# Altium footprint library Connector.PcbLib: 230 footprints (part 13 of 15)
Each footprint in its own frame and in the unit in brackets; x right, y up, seen from the top. Pads: shape width x height; smd on the part's side, far side on the other; paste and mask are expansions set on the pad; w line width, h text height; cw(c..) or ccw(c..) is an arc to the next point about the centre after c.
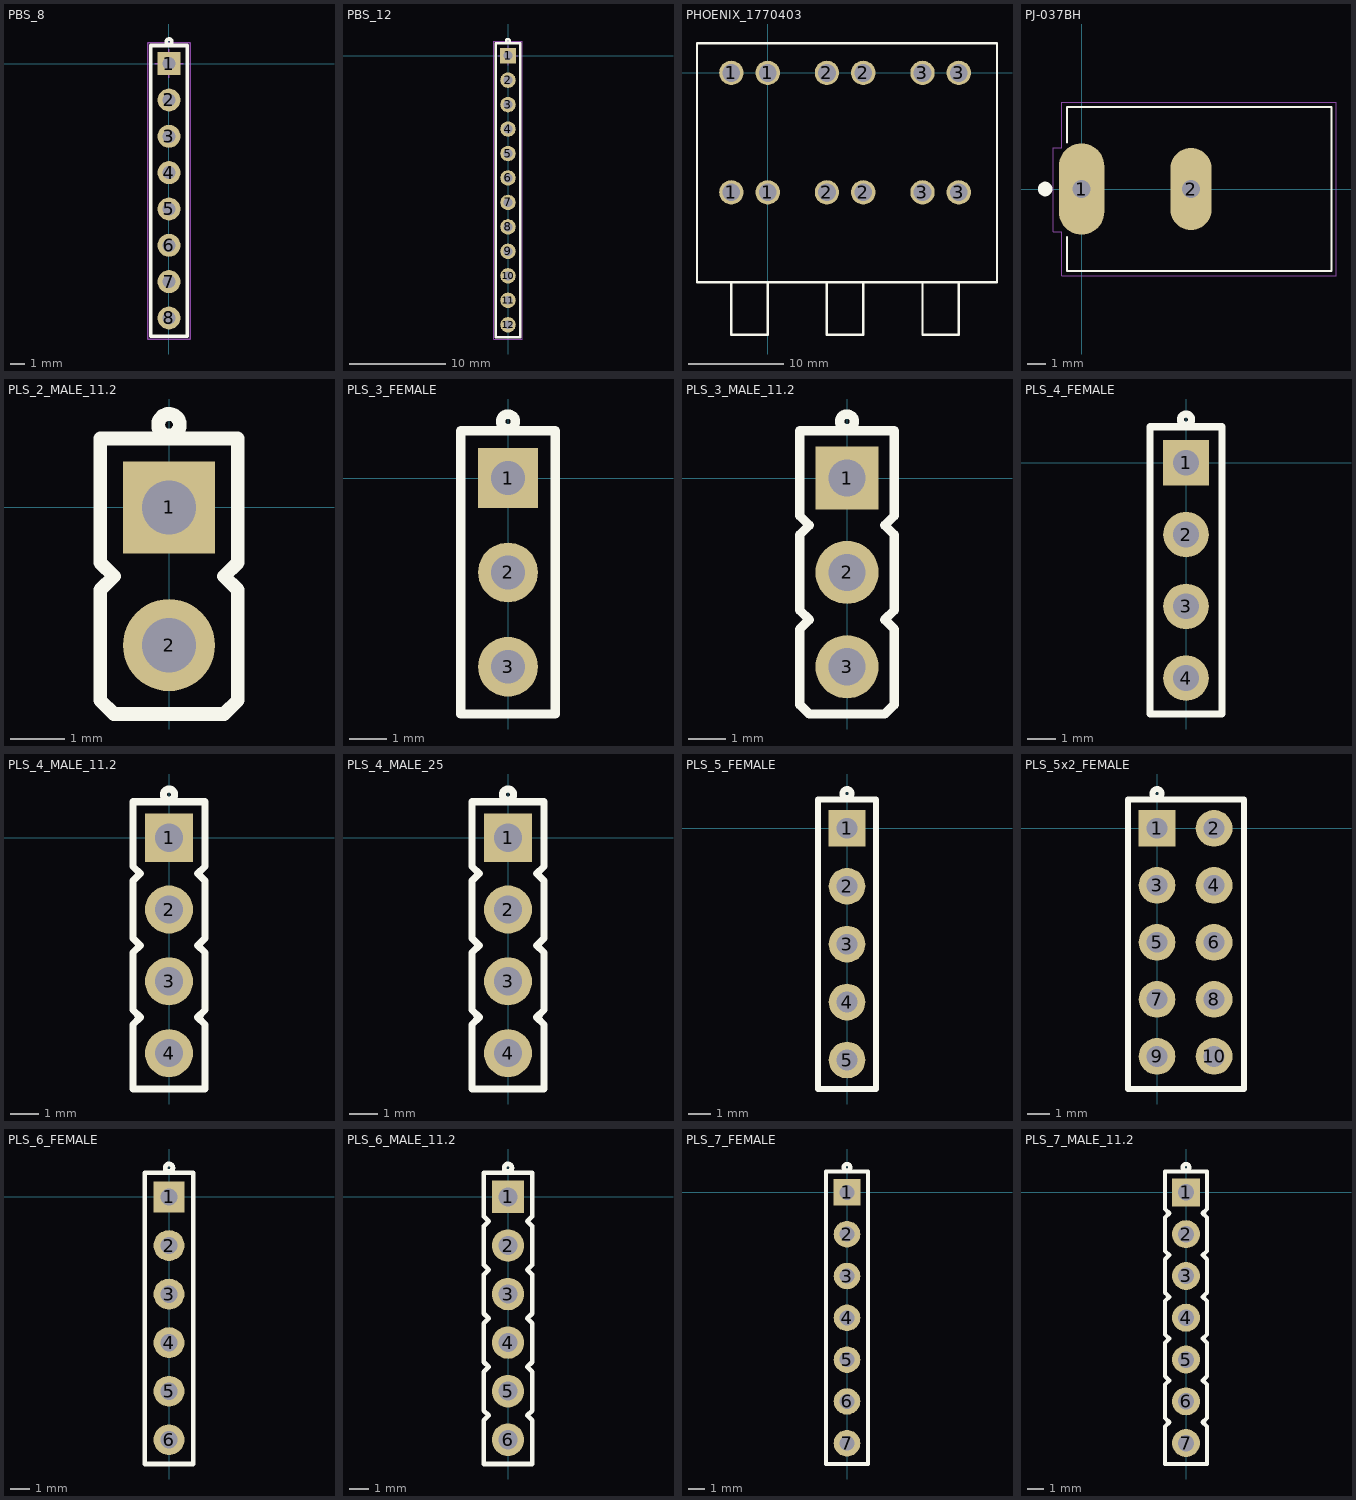
[diagram p12: the footprints below, top view; thin cyan lines are the x and y axes]

## PBS_8 [mm]
pads (8):
  rect 1.61x1.61 hole 0.91: 1(0,0)
  round 1.61 hole 0.91: 2(0,-2.54) 3(0,-5.08) 4(0,-7.62) 5(0,-10.16) 6(0,-12.7) 7(0,-15.24) 8(0,-17.78)
Top Overlay:
  circle w0.254: c0,1.524 r0.2
  lines w0.254: -1.27,-19.05 -1.27,1.27 1.27,1.27 1.27,-19.05 -1.27,-19.05
TopAssy:
  lines w0.1: -1.275,-19.05 1.275,-19.05 1.275,1.275 -1.275,1.275 -1.275,-19.05
Border:
  lines w0.1: -1,0 0,0 ; 0,-1 0,0 ; 0,1 0,0 ; 1,0 0,0 ; -1.475,-19.25 -1.475,1.475 1.475,1.475 1.475,1.25 1.475,1.025 1.475,-19.25 -1.475,-19.25
3D body "User Library-PBS-08.STEP": height 8.4, standoff -3.2, extent -1.27,-19.05 1.27,1.27

## PBS_12 [mm]
pads (12):
  rect 1.61x1.61 hole 0.91: 1(0,0)
  round 1.61 hole 0.91: 2(0,-2.54) 3(0,-5.08) 4(0,-7.62) 5(0,-10.16) 6(0,-12.7) 7(0,-15.24) 8(0,-17.78) 9(0,-20.32) 10(0,-22.86) 11(0,-25.4) 12(0,-27.94)
Top Overlay:
  circle w0.254: c0,1.524 r0.2
  lines w0.254: -1.27,-29.21 1.27,-29.21 1.27,1.27 -1.27,1.27 -1.27,-29.21
TopAssy:
  lines w0.1: -1.275,-29.21 1.275,-29.21 1.275,1.275 -1.275,1.275 -1.275,-29.21
Border:
  lines w0.1: -1,0 0,0 ; 0,-1 0,0 ; 0,1 0,0 ; 1,0 0,0 ; -1.475,-29.41 -1.475,1.475 1.475,1.475 1.475,1.25 1.475,1.025 1.475,-29.41 -1.475,-29.41
3D body "User Library-PBS-12-1.STEP": height 8.4, standoff -3.1, extent -1.272,-29.209 1.268,1.271

## PHOENIX_1770403 [mm] "TERM BLK 3P SIDE ENTRY 10MM PCB"
pads (12):
  round 2.55 hole 1.85: 1(-3.8,-12.5) 1(-3.8,0) 1(0,-12.5) 1(0,0) 2(6.2,-12.5) 2(6.2,0) 2(10,-12.5) 2(10,0) 3(16.2,-12.5) 3(16.2,0) 3(20,-12.5) 3(20,0)
Top Overlay:
  lines w0.254: -3.8,-21.9 -3.8,-27.4 -2.3,-27.4 0,-27.4 0,-21.9 ; -1,3.1 -3.8,3.1 -7.4,3.1 ; 6.2,-21.9 6.2,-27.4 7.7,-27.4 10,-27.4 10,-21.9 ; 16.2,-21.9 16.2,-27.4 17.7,-27.4 20,-27.4 20,-21.9 ; -7.4,3.1 24,3.1 24,-1.2 24,-21.9 1,-21.9 -7.4,-21.9 -7.4,-12.5 -7.4,-7.9 -7.4,3.1
3D body: height 31, standoff 28, extent 14,-27.4 22.2,-8
3D body: height 31, standoff 28, extent 4,-27.4 12.2,-8
3D body: height 31, standoff 28, extent -6,-27.4 2.2,-8
3D body: height 29, standoff 0, extent -7.4,-21.9 24,3.1

## PJ-037BH [mm]
pads (2):
  oval 2.5x5 hole 1: 1(0,0)
  oval 2.25x4.5 hole 1: 2(6,0)
Top Overlay:
  circle w0.4: c-2,0 r0.2
  lines w0.127: -0.8,-2.65 -0.8,-4.5 13.7,-4.5 13.7,4.5 -0.8,4.5 -0.8,2.55
TopAssy:
  lines w0: -0.5,-1.75 -0.5,1.75 0.5,1.75 0.5,-1.75 -0.5,-1.75 ; 5.5,-1.5 5.5,1.5 6.5,1.5 6.5,-1.5 5.5,-1.5
Border:
  lines w0.05: -1.55,-2.35 -1.55,2.25 -1.1,2.25 -1.1,4.75 13.95,4.75 13.95,-4.75 -1.1,-4.75 -1.1,-2.35 -1.55,-2.35
3D body: height 11, standoff 0, extent -0.8,-4.5 13.7,4.5

## PLS_2_MALE_11.2 [mm]
height 11.2
pads (2):
  rect 1.7x1.7 hole 1: 1(0,0)
  round 1.7 hole 1: 2(0,-2.54)
Top Overlay:
  circle w0.254: c0,1.524 r0.2
  lines w0.254: -1.27,-3.556 -1.27,-1.524 -1.016,-1.27 -1.27,-1.016 -1.27,1.27 1.27,1.27 1.27,-1.016 1.016,-1.27 1.27,-1.524 1.27,-3.556 1.016,-3.81 -1.016,-3.81 -1.27,-3.556
3D body: height 2, standoff 0, extent -1.27,-1.27 1.27,1.27
3D body: height 11, standoff 0, extent -0.496,-0.499 0.5,0.499
3D body: height 11, standoff 0, extent -0.496,-3.039 0.5,-2.041
3D body: height 2, standoff 0, extent -1.27,-3.81 1.27,-1.27

## PLS_3_FEMALE [mm]
pads (3):
  rect 1.61x1.61 hole 0.91: 1(0,0)
  round 1.61 hole 0.91: 2(0,-2.54) 3(0,-5.08)
Top Overlay:
  circle w0.254: c0,1.524 r0.2
  lines w0.254: -1.27,-6.35 -1.27,1.27 1.27,1.27 1.27,-6.35 -1.27,-6.35
3D body: height 8.5, standoff 0, extent -1.016,-6.35 1.016,-6.096
3D body: height 8.5, standoff 0, extent -1.016,-3.937 1.016,-3.683
3D body: height 8.5, standoff 0, extent -1.016,-1.397 1.016,-1.143
3D body: height 8.5, standoff 0, extent -1.016,1.016 1.016,1.27
3D body: height 8.5, standoff 0, extent 0.889,-6.35 1.27,1.27
3D body: height 8.5, standoff 0, extent -1.27,-6.35 -0.889,1.27

## PLS_3_MALE_11.2 [mm]
height 11.2
pads (3):
  rect 1.7x1.7 hole 1: 1(0,0)
  round 1.7 hole 1: 2(0,-2.54) 3(0,-5.08)
Top Overlay:
  circle w0.254: c0,1.524 r0.2
  lines w0.254: -1.27,-6.096 -1.016,-6.35 1.016,-6.35 1.27,-6.096 1.27,-4.064 1.016,-3.81 1.27,-3.556 1.27,-1.524 1.016,-1.27 1.27,-1.016 1.27,1.27 -1.27,1.27 -1.27,-1.016 -1.016,-1.27 -1.27,-1.524 -1.27,-3.556 -1.016,-3.81 -1.27,-4.064 -1.27,-6.096
3D body: height 2, standoff 0, extent -1.27,-6.35 1.27,-3.81
3D body: height 11, standoff 0, extent -0.496,-5.579 0.5,-4.581
3D body: height 2, standoff 0, extent -1.27,-3.81 1.27,-1.27
3D body: height 11, standoff 0, extent -0.496,-3.039 0.5,-2.041
3D body: height 11, standoff 0, extent -0.496,-0.499 0.5,0.499
3D body: height 2, standoff 0, extent -1.27,-1.27 1.27,1.27

## PLS_4_FEMALE [mm]
pads (4):
  rect 1.61x1.61 hole 0.91: 1(0,0)
  round 1.61 hole 0.91: 2(0,-2.54) 3(0,-5.08) 4(0,-7.62)
Top Overlay:
  circle w0.254: c0,1.524 r0.2
  lines w0.254: -1.27,-8.89 1.27,-8.89 1.27,1.27 -1.27,1.27 -1.27,-8.89
3D body: height 8.5, standoff 0, extent -1.016,-8.89 1.016,-8.636
3D body: height 8.5, standoff 0, extent -1.016,-6.477 1.016,-6.223
3D body: height 8.5, standoff 0, extent -1.016,-3.937 1.016,-3.683
3D body: height 8.5, standoff 0, extent -1.016,-1.397 1.016,-1.143
3D body: height 8.5, standoff 0, extent -1.016,1.016 1.016,1.27
3D body: height 8.5, standoff 0, extent 0.889,-8.89 1.27,1.27
3D body: height 8.5, standoff 0, extent -1.27,-8.89 -0.889,1.27

## PLS_4_MALE_11.2 [mm]
height 11.2
pads (4):
  rect 1.7x1.7 hole 1: 1(0,0)
  round 1.7 hole 1: 2(0,-2.54) 3(0,-5.08) 4(0,-7.62)
Top Overlay:
  circle w0.254: c0,1.524 r0.2
  lines w0.254: -1.27,-8.89 -1.27,-6.604 -1.016,-6.35 -1.27,-6.096 -1.27,-4.064 -1.016,-3.81 -1.27,-3.556 -1.27,-1.524 -1.016,-1.27 -1.27,-1.016 -1.27,1.27 1.27,1.27 1.27,-1.016 1.016,-1.27 1.27,-1.524 1.27,-3.556 1.016,-3.81 1.27,-4.064 1.27,-6.096 1.016,-6.35 1.27,-6.604 1.27,-8.89 -1.27,-8.89
3D body: height 2, standoff 0, extent -1.27,-1.27 1.27,1.27
3D body: height 11, standoff 0, extent -0.496,-0.499 0.5,0.499
3D body: height 11, standoff 0, extent -0.496,-3.039 0.5,-2.041
3D body: height 2, standoff 0, extent -1.27,-3.81 1.27,-1.27
3D body: height 11, standoff 0, extent -0.496,-5.579 0.5,-4.581
3D body: height 2, standoff 0, extent -1.27,-6.35 1.27,-3.81
3D body: height 11, standoff 0, extent -0.496,-8.119 0.5,-7.121
3D body: height 2, standoff 0, extent -1.27,-8.89 1.27,-6.35

## PLS_4_MALE_25 [mm]
height 25
pads (4):
  rect 1.7x1.7 hole 1: 1(0,0)
  round 1.7 hole 1: 2(0,-2.54) 3(0,-5.08) 4(0,-7.62)
Top Overlay:
  circle w0.254: c0,1.524 r0.2
  lines w0.254: -1.27,-8.89 1.27,-8.89 1.27,-6.604 1.016,-6.35 1.27,-6.096 1.27,-4.064 1.016,-3.81 1.27,-3.556 1.27,-1.524 1.016,-1.27 1.27,-1.016 1.27,1.27 -1.27,1.27 -1.27,-1.016 -1.016,-1.27 -1.27,-1.524 -1.27,-3.556 -1.016,-3.81 -1.27,-4.064 -1.27,-6.096 -1.016,-6.35 -1.27,-6.604 -1.27,-8.89
3D body: height 2, standoff 0, extent -1.27,-8.89 1.27,-6.35
3D body: height 25, standoff 0, extent -0.496,-8.119 0.5,-7.121
3D body: height 2, standoff 0, extent -1.27,-6.35 1.27,-3.81
3D body: height 25, standoff 0, extent -0.496,-5.579 0.5,-4.581
3D body: height 2, standoff 0, extent -1.27,-3.81 1.27,-1.27
3D body: height 25, standoff 0, extent -0.496,-3.039 0.5,-2.041
3D body: height 25, standoff 0, extent -0.496,-0.499 0.5,0.499
3D body: height 2, standoff 0, extent -1.27,-1.27 1.27,1.27

## PLS_5_FEMALE [mm]
pads (5):
  rect 1.61x1.61 hole 0.91: 1(0,0)
  round 1.61 hole 0.91: 2(0,-2.54) 3(0,-5.08) 4(0,-7.62) 5(0,-10.16)
Top Overlay:
  circle w0.254: c0,1.524 r0.2
  lines w0.254: -1.27,-11.43 1.27,-11.43 1.27,1.27 -1.27,1.27 -1.27,-11.43
3D body: height 8.5, standoff 0, extent -1.27,-11.43 -0.889,1.27
3D body: height 8.5, standoff 0, extent 0.889,-11.43 1.27,1.27
3D body: height 8.5, standoff 0, extent -1.016,1.016 1.016,1.27
3D body: height 8.5, standoff 0, extent -1.016,-1.397 1.016,-1.143
3D body: height 8.5, standoff 0, extent -1.016,-3.937 1.016,-3.683
3D body: height 8.5, standoff 0, extent -1.016,-6.477 1.016,-6.223
3D body: height 8.5, standoff 0, extent -1.016,-9.017 1.016,-8.763
3D body: height 8.5, standoff 0, extent -1.016,-11.43 1.016,-11.176

## PLS_5x2_FEMALE [mm]
pads (10):
  rect 1.61x1.61 hole 0.91: 1(0,0)
  round 1.61 hole 0.91: 2(2.5,0) 3(0,-2.5) 4(2.5,-2.5) 5(0,-5) 6(2.5,-5) 7(0,-7.5) 8(2.5,-7.5) 9(0,-10) 10(2.5,-10)
Top Overlay:
  circle w0.254: c0,1.524 r0.2
  lines w0.254: -1.27,-11.43 -1.27,1.27 3.81,1.27 3.81,-11.43 -1.27,-11.43
3D body: height 8.5, standoff 0, extent -1.016,-11.43 1.016,-11.176
3D body: height 8.5, standoff 0, extent -1.016,-9.017 1.016,-8.763
3D body: height 8.5, standoff 0, extent -1.016,-6.477 1.016,-6.223
3D body: height 8.5, standoff 0, extent -1.016,-3.937 1.016,-3.683
3D body: height 8.5, standoff 0, extent -1.016,-1.397 1.016,-1.143
3D body: height 8.5, standoff 0, extent -1.016,1.016 1.016,1.27
3D body: height 8.5, standoff 0, extent 0.889,-11.43 1.27,1.27
3D body: height 8.5, standoff 0, extent -1.27,-11.43 -0.889,1.27
3D body: height 8.5, standoff 0, extent 1.524,-11.43 3.556,-11.176
3D body: height 8.5, standoff 0, extent 1.524,-9.017 3.556,-8.763
3D body: height 8.5, standoff 0, extent 1.524,-6.477 3.556,-6.223
3D body: height 8.5, standoff 0, extent 1.524,-3.937 3.556,-3.683
3D body: height 8.5, standoff 0, extent 1.524,-1.397 3.556,-1.143
3D body: height 8.5, standoff 0, extent 1.524,1.016 3.556,1.27
3D body: height 8.5, standoff 0, extent 3.429,-11.43 3.81,1.27
3D body: height 8.5, standoff 0, extent 1.27,-11.43 1.651,1.27

## PLS_6_FEMALE [mm]
pads (6):
  rect 1.61x1.61 hole 0.91: 1(0,0)
  round 1.61 hole 0.91: 2(0,-2.54) 3(0,-5.08) 4(0,-7.62) 5(0,-10.16) 6(0,-12.7)
Top Overlay:
  circle w0.254: c0,1.524 r0.2
  lines w0.254: -1.27,-13.97 -1.27,1.27 1.27,1.27 1.27,-13.97 -1.27,-13.97
3D body: height 8.5, standoff 0, extent -1.016,-13.97 1.016,-13.716
3D body: height 8.5, standoff 0, extent -1.016,-11.557 1.016,-11.303
3D body: height 8.5, standoff 0, extent -1.016,-9.017 1.016,-8.763
3D body: height 8.5, standoff 0, extent -1.016,-6.477 1.016,-6.223
3D body: height 8.5, standoff 0, extent -1.016,-3.937 1.016,-3.683
3D body: height 8.5, standoff 0, extent -1.016,-1.397 1.016,-1.143
3D body: height 8.5, standoff 0, extent -1.016,1.016 1.016,1.27
3D body: height 8.5, standoff 0, extent 0.889,-13.97 1.27,1.27
3D body: height 8.5, standoff 0, extent -1.27,-13.97 -0.889,1.27

## PLS_6_MALE_11.2 [mm]
height 11.2
pads (6):
  rect 1.7x1.7 hole 1: 1(0,0)
  round 1.7 hole 1: 2(0,-2.54) 3(0,-5.08) 4(0,-7.62) 5(0,-10.16) 6(0,-12.7)
Top Overlay:
  circle w0.254: c0,1.524 r0.2
  lines w0.254: -1.27,-13.97 -1.27,-11.684 -1.016,-11.43 -1.27,-11.176 -1.27,-9.144 -1.016,-8.89 -1.27,-8.636 -1.27,-6.604 -1.016,-6.35 -1.27,-6.096 -1.27,-4.064 -1.016,-3.81 -1.27,-3.556 -1.27,-1.524 -1.016,-1.27 -1.27,-1.016 -1.27,1.27 1.27,1.27 1.27,-1.016 1.016,-1.27 1.27,-1.524 1.27,-3.556 1.016,-3.81 1.27,-4.064 1.27,-6.096 1.016,-6.35 1.27,-6.604 1.27,-8.636 1.016,-8.89 1.27,-9.144 1.27,-11.176 1.016,-11.43 1.27,-11.684 1.27,-13.97 -1.27,-13.97
3D body: height 2, standoff 0, extent -1.27,-1.27 1.27,1.27
3D body: height 11, standoff 0, extent -0.496,-0.499 0.5,0.499
3D body: height 11, standoff 0, extent -0.496,-3.039 0.5,-2.041
3D body: height 2, standoff 0, extent -1.27,-3.81 1.27,-1.27
3D body: height 11, standoff 0, extent -0.496,-5.579 0.5,-4.581
3D body: height 2, standoff 0, extent -1.27,-6.35 1.27,-3.81
3D body: height 11, standoff 0, extent -0.496,-13.199 0.5,-12.201
3D body: height 2, standoff 0, extent -1.27,-13.97 1.27,-11.43
3D body: height 11, standoff 0, extent -0.496,-8.119 0.5,-7.121
3D body: height 2, standoff 0, extent -1.27,-8.89 1.27,-6.35
3D body: height 11, standoff 0, extent -0.496,-10.659 0.5,-9.661
3D body: height 2, standoff 0, extent -1.27,-11.43 1.27,-8.89

## PLS_7_FEMALE [mm]
pads (7):
  rect 1.61x1.61 hole 0.91: 1(0,0)
  round 1.61 hole 0.91: 2(0,-2.54) 3(0,-5.08) 4(0,-7.62) 5(0,-10.16) 6(0,-12.7) 7(0,-15.24)
Top Overlay:
  circle w0.254: c0,1.524 r0.2
  lines w0.254: -1.27,-16.5 -1.27,1.27 1.27,1.27 1.27,-16.5 -1.27,-16.5
3D body: height 8.5, standoff 0, extent -1.27,-16.5 -0.889,1.27
3D body: height 8.5, standoff 0, extent 0.889,-16.51 1.27,1.27
3D body: height 8.5, standoff 0, extent -1.016,1.016 1.016,1.27
3D body: height 8.5, standoff 0, extent -1.016,-1.397 1.016,-1.143
3D body: height 8.5, standoff 0, extent -1.016,-3.937 1.016,-3.683
3D body: height 8.5, standoff 0, extent -1.016,-6.477 1.016,-6.223
3D body: height 8.5, standoff 0, extent -1.016,-9.017 1.016,-8.763
3D body: height 8.5, standoff 0, extent -1.016,-11.557 1.016,-11.303
3D body: height 8.5, standoff 0, extent -1.016,-14.224 1.016,-13.97
3D body: height 8.5, standoff 0, extent -1.016,-16.51 1.016,-16.256

## PLS_7_MALE_11.2 [mm]
height 11.2
pads (7):
  rect 1.7x1.7 hole 1: 1(0,0)
  round 1.7 hole 1: 2(0,-2.54) 3(0,-5.08) 4(0,-7.62) 5(0,-10.16) 6(0,-12.7) 7(0,-15.24)
Top Overlay:
  circle w0.254: c0,1.524 r0.2
  lines w0.254: -1.27,-16.51 1.27,-16.51 1.27,-14.224 1.016,-13.97 1.27,-13.716 1.27,-11.684 1.016,-11.43 1.27,-11.176 1.27,-9.144 1.016,-8.89 1.27,-8.636 1.27,-6.604 1.016,-6.35 1.27,-6.096 1.27,-4.064 1.016,-3.81 1.27,-3.556 1.27,-1.524 1.016,-1.27 1.27,-1.016 1.27,1.27 -1.27,1.27 -1.27,-1.016 -1.016,-1.27 -1.27,-1.524 -1.27,-3.556 -1.016,-3.81 -1.27,-4.064 -1.27,-6.096 -1.016,-6.35 -1.27,-6.604 -1.27,-8.636 -1.016,-8.89 -1.27,-9.144 -1.27,-11.176 -1.016,-11.43 -1.27,-11.684 -1.27,-13.716 -1.016,-13.97 -1.27,-14.224 -1.27,-16.51
3D body: height 2, standoff 0, extent -1.27,-11.43 1.27,-8.89
3D body: height 11, standoff 0, extent -0.496,-10.659 0.5,-9.661
3D body: height 2, standoff 0, extent -1.27,-8.89 1.27,-6.35
3D body: height 11, standoff 0, extent -0.496,-8.119 0.5,-7.121
3D body: height 2, standoff 0, extent -1.27,-16.51 1.27,-13.97
3D body: height 11, standoff 0, extent -0.496,-15.739 0.5,-14.741
3D body: height 2, standoff 0, extent -1.27,-6.35 1.27,-3.81
3D body: height 11, standoff 0, extent -0.496,-5.579 0.5,-4.581
3D body: height 2, standoff 0, extent -1.27,-3.81 1.27,-1.27
3D body: height 11, standoff 0, extent -0.496,-3.039 0.5,-2.041
3D body: height 11, standoff 0, extent -0.496,-0.499 0.5,0.499
3D body: height 2, standoff 0, extent -1.27,-1.27 1.27,1.27
3D body: height 2, standoff 0, extent -1.27,-13.97 1.27,-11.43
3D body: height 11, standoff 0, extent -0.496,-13.199 0.5,-12.201